# Altium footprint library texas.PCBLIB: 124 footprints (part 4 of 12) (continued)
## HTSSOP32DAP [mm]
pads (33):
  rect 0.3x1 smd: 1(-4.875,-3.95) 2(-4.225,-3.95) 3(-3.575,-3.95) 4(-2.925,-3.95) 5(-2.275,-3.95) 6(-1.625,-3.95) 7(-0.975,-3.95) 8(-0.325,-3.95) 9(0.325,-3.95) 10(0.975,-3.95) 11(1.625,-3.95) 12(2.275,-3.95) 13(2.925,-3.95) 14(3.575,-3.95) 15(4.225,-3.95) 16(4.875,-3.95) 17(4.875,3.95) 18(4.225,3.95) 19(3.575,3.95) 20(2.925,3.95) 21(2.275,3.95) 22(1.625,3.95) 23(0.975,3.95) 24(0.325,3.95) 25(-0.325,3.95) 26(-0.975,3.95) 27(-1.625,3.95) 28(-2.275,3.95) 29(-2.925,3.95) 30(-3.575,3.95) 31(-4.225,3.95) 32(-4.875,3.95)
  rect 11x5.2 smd: EXP(0,0)
Top Overlay:
  circle w0.102: c-4.55,-2.6 r0.325
  lines w0.102: -5.5,-3.4 5.5,-3.4 5.5,3.4 -5.5,3.4 -5.5,-3.4
Top Solder:
  rectangle: -5.035,-4.46 -4.715,-3.44
  rectangle: -5.02,-4.445 -4.73,-3.455
  rectangle: -4.385,-4.46 -4.065,-3.44
  rectangle: -4.37,-4.445 -4.08,-3.455
  rectangle: -3.735,-4.46 -3.415,-3.44
  rectangle: -3.72,-4.445 -3.43,-3.455
  rectangle: -3.085,-4.46 -2.765,-3.44
  rectangle: -3.07,-4.445 -2.78,-3.455
  rectangle: -2.435,-4.46 -2.115,-3.44
  rectangle: -2.42,-4.445 -2.13,-3.455
  rectangle: -1.785,-4.46 -1.465,-3.44
  rectangle: -1.77,-4.445 -1.48,-3.455
  rectangle: -1.135,-4.46 -0.815,-3.44
  rectangle: -1.12,-4.445 -0.83,-3.455
  rectangle: -0.485,-4.46 -0.165,-3.44
  rectangle: -0.47,-4.445 -0.18,-3.455
  rectangle: 0.165,-4.46 0.485,-3.44
  rectangle: 0.18,-4.445 0.47,-3.455
  rectangle: 0.815,-4.46 1.135,-3.44
  rectangle: 0.83,-4.445 1.12,-3.455
  rectangle: 1.465,-4.46 1.785,-3.44
  rectangle: 1.48,-4.445 1.77,-3.455
  rectangle: 2.115,-4.46 2.435,-3.44
  rectangle: 2.13,-4.445 2.42,-3.455
  rectangle: 2.765,-4.46 3.085,-3.44
  rectangle: 2.78,-4.445 3.07,-3.455
  rectangle: 3.415,-4.46 3.735,-3.44
  rectangle: 3.43,-4.445 3.72,-3.455
  rectangle: 4.065,-4.46 4.385,-3.44
  rectangle: 4.08,-4.445 4.37,-3.455
  rectangle: 4.715,-4.46 5.035,-3.44
  rectangle: 4.73,-4.445 5.02,-3.455
  region: 5.035,4.46 4.715,4.46 4.715,3.44 5.035,3.44
  region: 5.02,4.445 4.73,4.445 4.73,3.455 5.02,3.455
  region: 4.385,4.46 4.065,4.46 4.065,3.44 4.385,3.44
  region: 4.37,4.445 4.08,4.445 4.08,3.455 4.37,3.455
  region: 3.735,4.46 3.415,4.46 3.415,3.44 3.735,3.44
  region: 3.72,4.445 3.43,4.445 3.43,3.455 3.72,3.455
  region: 3.085,4.46 2.765,4.46 2.765,3.44 3.085,3.44
  region: 3.07,4.445 2.78,4.445 2.78,3.455 3.07,3.455
  region: 2.435,4.46 2.115,4.46 2.115,3.44 2.435,3.44
  region: 2.42,4.445 2.13,4.445 2.13,3.455 2.42,3.455
  region: 1.785,4.46 1.465,4.46 1.465,3.44 1.785,3.44
  region: 1.77,4.445 1.48,4.445 1.48,3.455 1.77,3.455
  region: 1.135,4.46 0.815,4.46 0.815,3.44 1.135,3.44
  region: 1.12,4.445 0.83,4.445 0.83,3.455 1.12,3.455
  region: 0.485,4.46 0.165,4.46 0.165,3.44 0.485,3.44
  region: 0.47,4.445 0.18,4.445 0.18,3.455 0.47,3.455
  region: -0.165,4.46 -0.485,4.46 -0.485,3.44 -0.165,3.44
  region: -0.18,4.445 -0.47,4.445 -0.47,3.455 -0.18,3.455
  region: -0.815,4.46 -1.135,4.46 -1.135,3.44 -0.815,3.44
  region: -0.83,4.445 -1.12,4.445 -1.12,3.455 -0.83,3.455
  region: -1.465,4.46 -1.785,4.46 -1.785,3.44 -1.465,3.44
  region: -1.48,4.445 -1.77,4.445 -1.77,3.455 -1.48,3.455
  region: -2.115,4.46 -2.435,4.46 -2.435,3.44 -2.115,3.44
  region: -2.13,4.445 -2.42,4.445 -2.42,3.455 -2.13,3.455
  rectangle: -5.5,-2.6 5.5,2.6
  region: -2.765,4.46 -3.085,4.46 -3.085,3.44 -2.765,3.44
  region: -2.78,4.445 -3.07,4.445 -3.07,3.455 -2.78,3.455
  region: -3.415,4.46 -3.735,4.46 -3.735,3.44 -3.415,3.44
  region: -3.43,4.445 -3.72,4.445 -3.72,3.455 -3.43,3.455
  region: -4.065,4.46 -4.385,4.46 -4.385,3.44 -4.065,3.44
  region: -4.08,4.445 -4.37,4.445 -4.37,3.455 -4.08,3.455
  region: -4.715,4.46 -5.035,4.46 -5.035,3.44 -4.715,3.44
  region: -4.73,4.445 -5.02,4.445 -5.02,3.455 -4.73,3.455
Mechanical 16:
  rectangle: -5.025,-4.2 -4.725,-3.45
  rectangle: -4.375,-4.2 -4.075,-3.45
  rectangle: -3.725,-4.2 -3.425,-3.45
  rectangle: -3.075,-4.2 -2.775,-3.45
  rectangle: -2.425,-4.2 -2.125,-3.45
  rectangle: -1.775,-4.2 -1.475,-3.45
  rectangle: -1.125,-4.2 -0.825,-3.45
  rectangle: -0.475,-4.2 -0.175,-3.45
  rectangle: 0.175,-4.2 0.475,-3.45
  rectangle: 0.825,-4.2 1.125,-3.45
  rectangle: 1.475,-4.2 1.775,-3.45
  rectangle: 2.125,-4.2 2.425,-3.45
  rectangle: 2.775,-4.2 3.075,-3.45
  rectangle: 3.425,-4.2 3.725,-3.45
  rectangle: 4.075,-4.2 4.375,-3.45
  rectangle: 4.725,-4.2 5.025,-3.45
  region: 5.025,4.2 4.725,4.2 4.725,3.45 5.025,3.45
  region: 4.375,4.2 4.075,4.2 4.075,3.45 4.375,3.45
  region: 3.725,4.2 3.425,4.2 3.425,3.45 3.725,3.45
  region: 3.075,4.2 2.775,4.2 2.775,3.45 3.075,3.45
  region: 2.425,4.2 2.125,4.2 2.125,3.45 2.425,3.45
  region: 1.775,4.2 1.475,4.2 1.475,3.45 1.775,3.45
  region: 1.125,4.2 0.825,4.2 0.825,3.45 1.125,3.45
  region: 0.475,4.2 0.175,4.2 0.175,3.45 0.475,3.45
  region: -0.175,4.2 -0.475,4.2 -0.475,3.45 -0.175,3.45
  region: -0.825,4.2 -1.125,4.2 -1.125,3.45 -0.825,3.45
  region: -1.475,4.2 -1.775,4.2 -1.775,3.45 -1.475,3.45
  region: -2.125,4.2 -2.425,4.2 -2.425,3.45 -2.125,3.45
  region: -2.775,4.2 -3.075,4.2 -3.075,3.45 -2.775,3.45
  region: -3.425,4.2 -3.725,4.2 -3.725,3.45 -3.425,3.45
  region: -4.075,4.2 -4.375,4.2 -4.375,3.45 -4.075,3.45
  region: -4.725,4.2 -5.025,4.2 -5.025,3.45 -4.725,3.45

## HTSSOP38DAP [mm]
pads (39):
  rect 0.3x1 smd: 1(-5.85,-3.95) 2(-5.2,-3.95) 3(-4.55,-3.95) 4(-3.9,-3.95) 5(-3.25,-3.95) 6(-2.6,-3.95) 7(-1.95,-3.95) 8(-1.3,-3.95) 9(-0.65,-3.95) 10(0,-3.95) 11(0.65,-3.95) 12(1.3,-3.95) 13(1.95,-3.95) 14(2.6,-3.95) 15(3.25,-3.95) 16(3.9,-3.95) 17(4.55,-3.95) 18(5.2,-3.95) 19(5.85,-3.95) 20(5.85,3.95) 21(5.2,3.95) 22(4.55,3.95) 23(3.9,3.95) 24(3.25,3.95) 25(2.6,3.95) 26(1.95,3.95) 27(1.3,3.95) 28(0.65,3.95) 29(0,3.95) 30(-0.65,3.95) 31(-1.3,3.95) 32(-1.95,3.95) 33(-2.6,3.95) 34(-3.25,3.95) 35(-3.9,3.95) 36(-4.55,3.95) 37(-5.2,3.95) 38(-5.85,3.95)
  rect 12.5x5.2 smd: EXP(0,0)
Top Overlay:
  circle w0.102: c-5.2,-2.6 r0.325
  lines w0.102: -6.25,-3.4 6.25,-3.4 6.25,3.4 -6.25,3.4 -6.25,-3.4
Top Solder:
  rectangle: -6.01,-4.46 -5.69,-3.44
  rectangle: -5.995,-4.445 -5.705,-3.455
  rectangle: -5.36,-4.46 -5.04,-3.44
  rectangle: -5.345,-4.445 -5.055,-3.455
  rectangle: -4.71,-4.46 -4.39,-3.44
  rectangle: -4.695,-4.445 -4.405,-3.455
  rectangle: -4.06,-4.46 -3.74,-3.44
  rectangle: -4.045,-4.445 -3.755,-3.455
  rectangle: -3.41,-4.46 -3.09,-3.44
  rectangle: -3.395,-4.445 -3.105,-3.455
  rectangle: -2.76,-4.46 -2.44,-3.44
  rectangle: -2.745,-4.445 -2.455,-3.455
  rectangle: -2.11,-4.46 -1.79,-3.44
  rectangle: -2.095,-4.445 -1.805,-3.455
  rectangle: -1.46,-4.46 -1.14,-3.44
  rectangle: -1.445,-4.445 -1.155,-3.455
  rectangle: -0.81,-4.46 -0.49,-3.44
  rectangle: -0.795,-4.445 -0.505,-3.455
  rectangle: -0.16,-4.46 0.16,-3.44
  rectangle: -0.145,-4.445 0.145,-3.455
  rectangle: 0.49,-4.46 0.81,-3.44
  rectangle: 0.505,-4.445 0.795,-3.455
  rectangle: 1.14,-4.46 1.46,-3.44
  rectangle: 1.155,-4.445 1.445,-3.455
  rectangle: 1.79,-4.46 2.11,-3.44
  rectangle: 1.805,-4.445 2.095,-3.455
  rectangle: 2.44,-4.46 2.76,-3.44
  rectangle: 2.455,-4.445 2.745,-3.455
  rectangle: 3.09,-4.46 3.41,-3.44
  rectangle: 3.105,-4.445 3.395,-3.455
  rectangle: 3.74,-4.46 4.06,-3.44
  rectangle: 3.755,-4.445 4.045,-3.455
  rectangle: -6.25,-2.6 6.25,2.6
  rectangle: 4.39,-4.46 4.71,-3.44
  rectangle: 4.405,-4.445 4.695,-3.455
  rectangle: 5.04,-4.46 5.36,-3.44
  rectangle: 5.055,-4.445 5.345,-3.455
  rectangle: 5.69,-4.46 6.01,-3.44
  rectangle: 5.705,-4.445 5.995,-3.455
  region: 6.01,4.46 5.69,4.46 5.69,3.44 6.01,3.44
  region: 5.995,4.445 5.705,4.445 5.705,3.455 5.995,3.455
  region: 5.36,4.46 5.04,4.46 5.04,3.44 5.36,3.44
  region: 5.345,4.445 5.055,4.445 5.055,3.455 5.345,3.455
  region: 4.71,4.46 4.39,4.46 4.39,3.44 4.71,3.44
  region: 4.695,4.445 4.405,4.445 4.405,3.455 4.695,3.455
  region: 4.06,4.46 3.74,4.46 3.74,3.44 4.06,3.44
  region: 4.045,4.445 3.755,4.445 3.755,3.455 4.045,3.455
  region: 3.41,4.46 3.09,4.46 3.09,3.44 3.41,3.44
  region: 3.395,4.445 3.105,4.445 3.105,3.455 3.395,3.455
  region: 2.76,4.46 2.44,4.46 2.44,3.44 2.76,3.44
  region: 2.745,4.445 2.455,4.445 2.455,3.455 2.745,3.455
  region: 2.11,4.46 1.79,4.46 1.79,3.44 2.11,3.44
  region: 2.095,4.445 1.805,4.445 1.805,3.455 2.095,3.455
  region: 1.46,4.46 1.14,4.46 1.14,3.44 1.46,3.44
  region: 1.445,4.445 1.155,4.445 1.155,3.455 1.445,3.455
  region: 0.81,4.46 0.49,4.46 0.49,3.44 0.81,3.44
  region: 0.795,4.445 0.505,4.445 0.505,3.455 0.795,3.455
  region: 0.16,4.46 -0.16,4.46 -0.16,3.44 0.16,3.44
  region: 0.145,4.445 -0.145,4.445 -0.145,3.455 0.145,3.455
  region: -0.49,4.46 -0.81,4.46 -0.81,3.44 -0.49,3.44
  region: -0.505,4.445 -0.795,4.445 -0.795,3.455 -0.505,3.455
  region: -1.14,4.46 -1.46,4.46 -1.46,3.44 -1.14,3.44
  region: -1.155,4.445 -1.445,4.445 -1.445,3.455 -1.155,3.455
  region: -1.79,4.46 -2.11,4.46 -2.11,3.44 -1.79,3.44
  region: -1.805,4.445 -2.095,4.445 -2.095,3.455 -1.805,3.455
  region: -2.44,4.46 -2.76,4.46 -2.76,3.44 -2.44,3.44
  region: -2.455,4.445 -2.745,4.445 -2.745,3.455 -2.455,3.455
  region: -3.09,4.46 -3.41,4.46 -3.41,3.44 -3.09,3.44
  region: -3.105,4.445 -3.395,4.445 -3.395,3.455 -3.105,3.455
  region: -3.74,4.46 -4.06,4.46 -4.06,3.44 -3.74,3.44
  region: -3.755,4.445 -4.045,4.445 -4.045,3.455 -3.755,3.455
  region: -4.39,4.46 -4.71,4.46 -4.71,3.44 -4.39,3.44
  region: -4.405,4.445 -4.695,4.445 -4.695,3.455 -4.405,3.455
  region: -5.04,4.46 -5.36,4.46 -5.36,3.44 -5.04,3.44
  region: -5.055,4.445 -5.345,4.445 -5.345,3.455 -5.055,3.455
  region: -5.69,4.46 -6.01,4.46 -6.01,3.44 -5.69,3.44
  region: -5.705,4.445 -5.995,4.445 -5.995,3.455 -5.705,3.455
Mechanical 16:
  rectangle: -6,-4.2 -5.7,-3.45
  rectangle: -5.35,-4.2 -5.05,-3.45
  rectangle: -4.7,-4.2 -4.4,-3.45
  rectangle: -4.05,-4.2 -3.75,-3.45
  rectangle: -3.4,-4.2 -3.1,-3.45
  rectangle: -2.75,-4.2 -2.45,-3.45
  rectangle: -2.1,-4.2 -1.8,-3.45
  rectangle: -1.45,-4.2 -1.15,-3.45
  rectangle: -0.8,-4.2 -0.5,-3.45
  rectangle: -0.15,-4.2 0.15,-3.45
  rectangle: 0.5,-4.2 0.8,-3.45
  rectangle: 1.15,-4.2 1.45,-3.45
  rectangle: 1.8,-4.2 2.1,-3.45
  rectangle: 2.45,-4.2 2.75,-3.45
  rectangle: 3.1,-4.2 3.4,-3.45
  rectangle: 3.75,-4.2 4.05,-3.45
  rectangle: 4.4,-4.2 4.7,-3.45
  rectangle: 5.05,-4.2 5.35,-3.45
  rectangle: 5.7,-4.2 6,-3.45
  region: 6,4.2 5.7,4.2 5.7,3.45 6,3.45
  region: 5.35,4.2 5.05,4.2 5.05,3.45 5.35,3.45
  region: 4.7,4.2 4.4,4.2 4.4,3.45 4.7,3.45
  region: 4.05,4.2 3.75,4.2 3.75,3.45 4.05,3.45
  region: 3.4,4.2 3.1,4.2 3.1,3.45 3.4,3.45
  region: 2.75,4.2 2.45,4.2 2.45,3.45 2.75,3.45
  region: 2.1,4.2 1.8,4.2 1.8,3.45 2.1,3.45
  region: 1.45,4.2 1.15,4.2 1.15,3.45 1.45,3.45
  region: 0.8,4.2 0.5,4.2 0.5,3.45 0.8,3.45
  region: 0.15,4.2 -0.15,4.2 -0.15,3.45 0.15,3.45
  region: -0.5,4.2 -0.8,4.2 -0.8,3.45 -0.5,3.45
  region: -1.15,4.2 -1.45,4.2 -1.45,3.45 -1.15,3.45
  region: -1.8,4.2 -2.1,4.2 -2.1,3.45 -1.8,3.45
  region: -2.45,4.2 -2.75,4.2 -2.75,3.45 -2.45,3.45
  region: -3.1,4.2 -3.4,4.2 -3.4,3.45 -3.1,3.45
  region: -3.75,4.2 -4.05,4.2 -4.05,3.45 -3.75,3.45
  region: -4.4,4.2 -4.7,4.2 -4.7,3.45 -4.4,3.45
  region: -5.05,4.2 -5.35,4.2 -5.35,3.45 -5.05,3.45
  region: -5.7,4.2 -6,4.2 -6,3.45 -5.7,3.45

## HTSSOP38DCP [mm]
pads (39):
  rect 0.3x1.1 smd: 1(-4.5,-2.9) 2(-4,-2.9) 3(-3.5,-2.9) 4(-3,-2.9) 5(-2.5,-2.9) 6(-2,-2.9) 7(-1.5,-2.9) 8(-1,-2.9) 9(-0.5,-2.9) 10(0,-2.9) 11(0.5,-2.9) 12(1,-2.9) 13(1.5,-2.9) 14(2,-2.9) 15(2.5,-2.9) 16(3,-2.9) 17(3.5,-2.9) 18(4,-2.9) 19(4.5,-2.9) 20(4.5,2.9) 21(4,2.9) 22(3.5,2.9) 23(3,2.9) 24(2.5,2.9) 25(2,2.9) 26(1.5,2.9) 27(1,2.9) 28(0.5,2.9) 29(0,2.9) 30(-0.5,2.9) 31(-1,2.9) 32(-1.5,2.9) 33(-2,2.9) 34(-2.5,2.9) 35(-3,2.9) 36(-3.5,2.9) 37(-4,2.9) 38(-4.5,2.9)
  rect 9.7x3.4 smd: EXP@1(0,0)
Top Overlay:
  circle w0.102: c-3.195,-1.35 r0.283
  lines w0.102: -4.85,-2.2 4.85,-2.2 4.85,2.2 -4.85,2.2 -4.85,-2.2
Top Paste:
  rectangle: -4.64,-3.435 -4.36,-2.365
  rectangle: -4.14,-3.435 -3.86,-2.365
  rectangle: -3.64,-3.435 -3.36,-2.365
  rectangle: -3.14,-3.435 -2.86,-2.365
  rectangle: -2.64,-3.435 -2.36,-2.365
  rectangle: -2.14,-3.435 -1.86,-2.365
  rectangle: -1.64,-3.435 -1.36,-2.365
  rectangle: -1.14,-3.435 -0.86,-2.365
  rectangle: -0.64,-3.435 -0.36,-2.365
  rectangle: -0.14,-3.435 0.14,-2.365
  rectangle: 0.36,-3.435 0.64,-2.365
  rectangle: 0.86,-3.435 1.14,-2.365
  rectangle: 1.36,-3.435 1.64,-2.365
  rectangle: 1.86,-3.435 2.14,-2.365
  rectangle: 2.36,-3.435 2.64,-2.365
  rectangle: 2.86,-3.435 3.14,-2.365
  rectangle: 3.36,-3.435 3.64,-2.365
  rectangle: 3.86,-3.435 4.14,-2.365
  rectangle: 4.36,-3.435 4.64,-2.365
  region: 4.64,3.435 4.36,3.435 4.36,2.365 4.64,2.365
  region: 4.14,3.435 3.86,3.435 3.86,2.365 4.14,2.365
  region: 3.64,3.435 3.36,3.435 3.36,2.365 3.64,2.365
  region: 3.14,3.435 2.86,3.435 2.86,2.365 3.14,2.365
  region: 2.64,3.435 2.36,3.435 2.36,2.365 2.64,2.365
  region: 2.14,3.435 1.86,3.435 1.86,2.365 2.14,2.365
  region: 1.64,3.435 1.36,3.435 1.36,2.365 1.64,2.365
  region: 1.14,3.435 0.86,3.435 0.86,2.365 1.14,2.365
  region: 0.64,3.435 0.36,3.435 0.36,2.365 0.64,2.365
  region: 0.14,3.435 -0.14,3.435 -0.14,2.365 0.14,2.365
  region: -0.36,3.435 -0.64,3.435 -0.64,2.365 -0.36,2.365
  region: -0.86,3.435 -1.14,3.435 -1.14,2.365 -0.86,2.365
  region: -1.36,3.435 -1.64,3.435 -1.64,2.365 -1.36,2.365
  region: -1.86,3.435 -2.14,3.435 -2.14,2.365 -1.86,2.365
  region: -2.36,3.435 -2.64,3.435 -2.64,2.365 -2.36,2.365
  region: -2.86,3.435 -3.14,3.435 -3.14,2.365 -2.86,2.365
  region: -3.36,3.435 -3.64,3.435 -3.64,2.365 -3.36,2.365
  region: -3.86,3.435 -4.14,3.435 -4.14,2.365 -3.86,2.365
  region: -4.36,3.435 -4.64,3.435 -4.64,2.365 -4.36,2.365
Top Solder:
  rectangle: -4.655,-3.455 -4.345,-2.345
  rectangle: -4.155,-3.455 -3.845,-2.345
  rectangle: -3.655,-3.455 -3.345,-2.345
  rectangle: -3.155,-3.455 -2.845,-2.345
  rectangle: -2.655,-3.455 -2.345,-2.345
  rectangle: -2.155,-3.455 -1.845,-2.345
  rectangle: -1.655,-3.455 -1.345,-2.345
  rectangle: -1.155,-3.455 -0.845,-2.345
  rectangle: -0.655,-3.455 -0.345,-2.345
  rectangle: -0.155,-3.455 0.155,-2.345
  rectangle: 0.345,-3.455 0.655,-2.345
  rectangle: 0.845,-3.455 1.155,-2.345
  rectangle: 1.345,-3.455 1.655,-2.345
  rectangle: 1.845,-3.455 2.155,-2.345
  rectangle: 2.345,-3.455 2.655,-2.345
  rectangle: 2.845,-3.455 3.155,-2.345
  rectangle: 3.345,-3.455 3.655,-2.345
  rectangle: 3.845,-3.455 4.155,-2.345
  rectangle: 4.345,-3.455 4.655,-2.345
  region: 4.655,3.455 4.345,3.455 4.345,2.345 4.655,2.345
  region: 4.155,3.455 3.845,3.455 3.845,2.345 4.155,2.345
  region: 3.655,3.455 3.345,3.455 3.345,2.345 3.655,2.345
  region: 3.155,3.455 2.845,3.455 2.845,2.345 3.155,2.345
  region: 2.655,3.455 2.345,3.455 2.345,2.345 2.655,2.345
  region: 2.155,3.455 1.845,3.455 1.845,2.345 2.155,2.345
  region: 1.655,3.455 1.345,3.455 1.345,2.345 1.655,2.345
  region: 1.155,3.455 0.845,3.455 0.845,2.345 1.155,2.345
  region: 0.655,3.455 0.345,3.455 0.345,2.345 0.655,2.345
  rectangle: -4.85,-1.7 4.85,1.7
  region: 0.155,3.455 -0.155,3.455 -0.155,2.345 0.155,2.345
  region: -0.345,3.455 -0.655,3.455 -0.655,2.345 -0.345,2.345
  region: -0.845,3.455 -1.155,3.455 -1.155,2.345 -0.845,2.345
  region: -1.345,3.455 -1.655,3.455 -1.655,2.345 -1.345,2.345
  region: -1.845,3.455 -2.155,3.455 -2.155,2.345 -1.845,2.345
  region: -2.345,3.455 -2.655,3.455 -2.655,2.345 -2.345,2.345
  region: -2.845,3.455 -3.155,3.455 -3.155,2.345 -2.845,2.345
  region: -3.345,3.455 -3.655,3.455 -3.655,2.345 -3.345,2.345
  region: -3.845,3.455 -4.155,3.455 -4.155,2.345 -3.845,2.345
  region: -4.345,3.455 -4.655,3.455 -4.655,2.345 -4.345,2.345
Mechanical 16:
  rectangle: -4.61,-3.3 -4.38,-2.245
  rectangle: -4.11,-3.3 -3.88,-2.245
  rectangle: -3.61,-3.3 -3.38,-2.245
  rectangle: -3.11,-3.3 -2.88,-2.245
  rectangle: -2.61,-3.3 -2.38,-2.245
  rectangle: -2.11,-3.3 -1.88,-2.245
  rectangle: -1.61,-3.3 -1.38,-2.245
  rectangle: -1.11,-3.3 -0.88,-2.245
  rectangle: -0.61,-3.3 -0.38,-2.245
  rectangle: -0.11,-3.3 0.12,-2.245
  rectangle: 0.39,-3.3 0.62,-2.245
  rectangle: 0.89,-3.3 1.12,-2.245
  rectangle: 1.39,-3.3 1.62,-2.245
  rectangle: 1.89,-3.3 2.12,-2.245
  rectangle: 2.39,-3.3 2.62,-2.245
  rectangle: 2.89,-3.3 3.12,-2.245
  rectangle: 3.39,-3.3 3.62,-2.245
  rectangle: 3.89,-3.3 4.12,-2.245
  rectangle: 4.39,-3.3 4.62,-2.245
  region: 4.61,3.3 4.38,3.3 4.38,2.245 4.61,2.245
  region: 4.11,3.3 3.88,3.3 3.88,2.245 4.11,2.245
  region: 3.61,3.3 3.38,3.3 3.38,2.245 3.61,2.245
  region: 3.11,3.3 2.88,3.3 2.88,2.245 3.11,2.245
  region: 2.61,3.3 2.38,3.3 2.38,2.245 2.61,2.245
  region: 2.11,3.3 1.88,3.3 1.88,2.245 2.11,2.245
  region: 1.61,3.3 1.38,3.3 1.38,2.245 1.61,2.245
  region: 1.11,3.3 0.88,3.3 0.88,2.245 1.11,2.245
  region: 0.61,3.3 0.38,3.3 0.38,2.245 0.61,2.245
  region: 0.11,3.3 -0.12,3.3 -0.12,2.245 0.11,2.245
  region: -0.39,3.3 -0.62,3.3 -0.62,2.245 -0.39,2.245
  region: -0.89,3.3 -1.12,3.3 -1.12,2.245 -0.89,2.245
  region: -1.39,3.3 -1.62,3.3 -1.62,2.245 -1.39,2.245
  region: -1.89,3.3 -2.12,3.3 -2.12,2.245 -1.89,2.245
  region: -2.39,3.3 -2.62,3.3 -2.62,2.245 -2.39,2.245
  region: -2.89,3.3 -3.12,3.3 -3.12,2.245 -2.89,2.245
  region: -3.39,3.3 -3.62,3.3 -3.62,2.245 -3.39,2.245
  region: -3.89,3.3 -4.12,3.3 -4.12,2.245 -3.89,2.245
  region: -4.39,3.3 -4.62,3.3 -4.62,2.245 -4.39,2.245

## HTSSOP44DCP [mm]
pads (45):
  rect 0.3x1.1 smd: 1(-5.25,-2.9) 2(-4.75,-2.9) 3(-4.25,-2.9) 4(-3.75,-2.9) 5(-3.25,-2.9) 6(-2.75,-2.9) 7(-2.25,-2.9) 8(-1.75,-2.9) 9(-1.25,-2.9) 10(-0.75,-2.9) 11(-0.25,-2.9) 12(0.25,-2.9) 13(0.75,-2.9) 14(1.25,-2.9) 15(1.75,-2.9) 16(2.25,-2.9) 17(2.75,-2.9) 18(3.25,-2.9) 19(3.75,-2.9) 20(4.25,-2.9) 21(4.75,-2.9) 22(5.25,-2.9) 23(5.25,2.9) 24(4.75,2.9) 25(4.25,2.9) 26(3.75,2.9) 27(3.25,2.9) 28(2.75,2.9) 29(2.25,2.9) 30(1.75,2.9) 31(1.25,2.9) 32(0.75,2.9) 33(0.25,2.9) 34(-0.25,2.9) 35(-0.75,2.9) 36(-1.25,2.9) 37(-1.75,2.9) 38(-2.25,2.9) 39(-2.75,2.9) 40(-3.25,2.9) 41(-3.75,2.9) 42(-4.25,2.9) 43(-4.75,2.9) 44(-5.25,2.9)
  rect 11.3x3.4 smd: EXP(0,0)
Top Overlay:
  circle w0.102: c-4.695,-1.35 r0.283
  lines w0.102: -5.65,-2.2 5.65,-2.2 5.65,2.2 -5.65,2.2 -5.65,-2.2
Top Paste:
  rectangle: -5.39,-3.435 -5.11,-2.365
  rectangle: -4.89,-3.435 -4.61,-2.365
  rectangle: -4.39,-3.435 -4.11,-2.365
  rectangle: -3.89,-3.435 -3.61,-2.365
  rectangle: -3.39,-3.435 -3.11,-2.365
  rectangle: -2.89,-3.435 -2.61,-2.365
  rectangle: -2.39,-3.435 -2.11,-2.365
  rectangle: -1.89,-3.435 -1.61,-2.365
  rectangle: -1.39,-3.435 -1.11,-2.365
  rectangle: -0.89,-3.435 -0.61,-2.365
  rectangle: -0.39,-3.435 -0.11,-2.365
  rectangle: 0.11,-3.435 0.39,-2.365
  rectangle: 0.61,-3.435 0.89,-2.365
  rectangle: 1.11,-3.435 1.39,-2.365
  rectangle: 1.61,-3.435 1.89,-2.365
  rectangle: 2.11,-3.435 2.39,-2.365
  rectangle: 2.61,-3.435 2.89,-2.365
  rectangle: 3.11,-3.435 3.39,-2.365
  rectangle: 3.61,-3.435 3.89,-2.365
  rectangle: 4.11,-3.435 4.39,-2.365
  rectangle: 4.61,-3.435 4.89,-2.365
  rectangle: 5.11,-3.435 5.39,-2.365
  region: 5.39,3.435 5.11,3.435 5.11,2.365 5.39,2.365
  region: 4.89,3.435 4.61,3.435 4.61,2.365 4.89,2.365
  region: 4.39,3.435 4.11,3.435 4.11,2.365 4.39,2.365
  region: 3.89,3.435 3.61,3.435 3.61,2.365 3.89,2.365
  region: 3.39,3.435 3.11,3.435 3.11,2.365 3.39,2.365
  region: 2.89,3.435 2.61,3.435 2.61,2.365 2.89,2.365
  region: 2.39,3.435 2.11,3.435 2.11,2.365 2.39,2.365
  region: 1.89,3.435 1.61,3.435 1.61,2.365 1.89,2.365
  region: 1.39,3.435 1.11,3.435 1.11,2.365 1.39,2.365
  region: 0.89,3.435 0.61,3.435 0.61,2.365 0.89,2.365
  region: 0.39,3.435 0.11,3.435 0.11,2.365 0.39,2.365
  region: -0.11,3.435 -0.39,3.435 -0.39,2.365 -0.11,2.365
  region: -0.61,3.435 -0.89,3.435 -0.89,2.365 -0.61,2.365
  region: -1.11,3.435 -1.39,3.435 -1.39,2.365 -1.11,2.365
  region: -1.61,3.435 -1.89,3.435 -1.89,2.365 -1.61,2.365
  region: -2.11,3.435 -2.39,3.435 -2.39,2.365 -2.11,2.365
  region: -2.61,3.435 -2.89,3.435 -2.89,2.365 -2.61,2.365
  region: -3.11,3.435 -3.39,3.435 -3.39,2.365 -3.11,2.365
  region: -3.61,3.435 -3.89,3.435 -3.89,2.365 -3.61,2.365
  region: -4.11,3.435 -4.39,3.435 -4.39,2.365 -4.11,2.365
  region: -4.61,3.435 -4.89,3.435 -4.89,2.365 -4.61,2.365
  region: -5.11,3.435 -5.39,3.435 -5.39,2.365 -5.11,2.365
Top Solder:
  rectangle: -5.405,-3.455 -5.095,-2.345
  rectangle: -4.905,-3.455 -4.595,-2.345
  rectangle: -4.405,-3.455 -4.095,-2.345
  rectangle: -3.905,-3.455 -3.595,-2.345
  rectangle: -3.405,-3.455 -3.095,-2.345
  rectangle: -2.905,-3.455 -2.595,-2.345
  rectangle: -2.405,-3.455 -2.095,-2.345
  rectangle: -1.905,-3.455 -1.595,-2.345
  rectangle: -1.405,-3.455 -1.095,-2.345
  rectangle: -0.905,-3.455 -0.595,-2.345
  rectangle: -0.405,-3.455 -0.095,-2.345
  rectangle: 0.095,-3.455 0.405,-2.345
  rectangle: 0.595,-3.455 0.905,-2.345
  rectangle: 1.095,-3.455 1.405,-2.345
  rectangle: 1.595,-3.455 1.905,-2.345
  rectangle: 2.095,-3.455 2.405,-2.345
  rectangle: 2.595,-3.455 2.905,-2.345
  rectangle: 3.095,-3.455 3.405,-2.345
  rectangle: 3.595,-3.455 3.905,-2.345
  rectangle: 4.095,-3.455 4.405,-2.345
  rectangle: 4.595,-3.455 4.905,-2.345
  rectangle: 5.095,-3.455 5.405,-2.345
  region: 5.405,3.455 5.095,3.455 5.095,2.345 5.405,2.345
  region: 4.905,3.455 4.595,3.455 4.595,2.345 4.905,2.345
  region: 4.405,3.455 4.095,3.455 4.095,2.345 4.405,2.345
  region: 3.905,3.455 3.595,3.455 3.595,2.345 3.905,2.345
  region: 3.405,3.455 3.095,3.455 3.095,2.345 3.405,2.345
  region: 2.905,3.455 2.595,3.455 2.595,2.345 2.905,2.345
  rectangle: -5.65,-1.7 5.65,1.7
  region: 2.405,3.455 2.095,3.455 2.095,2.345 2.405,2.345
  region: 1.905,3.455 1.595,3.455 1.595,2.345 1.905,2.345
  region: 1.405,3.455 1.095,3.455 1.095,2.345 1.405,2.345
  region: 0.905,3.455 0.595,3.455 0.595,2.345 0.905,2.345
  region: 0.405,3.455 0.095,3.455 0.095,2.345 0.405,2.345
  region: -0.095,3.455 -0.405,3.455 -0.405,2.345 -0.095,2.345
  region: -0.595,3.455 -0.905,3.455 -0.905,2.345 -0.595,2.345
  region: -1.095,3.455 -1.405,3.455 -1.405,2.345 -1.095,2.345
  region: -1.595,3.455 -1.905,3.455 -1.905,2.345 -1.595,2.345
  region: -2.095,3.455 -2.405,3.455 -2.405,2.345 -2.095,2.345
  region: -2.595,3.455 -2.905,3.455 -2.905,2.345 -2.595,2.345
  region: -3.095,3.455 -3.405,3.455 -3.405,2.345 -3.095,2.345
  region: -3.595,3.455 -3.905,3.455 -3.905,2.345 -3.595,2.345
  region: -4.095,3.455 -4.405,3.455 -4.405,2.345 -4.095,2.345
  region: -4.595,3.455 -4.905,3.455 -4.905,2.345 -4.595,2.345
  region: -5.095,3.455 -5.405,3.455 -5.405,2.345 -5.095,2.345
Mechanical 16:
  rectangle: -5.36,-3.3 -5.13,-2.245
  rectangle: -4.86,-3.3 -4.63,-2.245
  rectangle: -4.36,-3.3 -4.13,-2.245
  rectangle: -3.86,-3.3 -3.63,-2.245
  rectangle: -3.36,-3.3 -3.13,-2.245
  rectangle: -2.86,-3.3 -2.63,-2.245
  rectangle: -2.36,-3.3 -2.13,-2.245
  rectangle: -1.86,-3.3 -1.63,-2.245
  rectangle: -1.36,-3.3 -1.13,-2.245
  rectangle: -0.86,-3.3 -0.63,-2.245
  rectangle: -0.36,-3.3 -0.13,-2.245
  rectangle: 0.14,-3.3 0.37,-2.245
  rectangle: 0.64,-3.3 0.87,-2.245
  rectangle: 1.14,-3.3 1.37,-2.245
  rectangle: 1.64,-3.3 1.87,-2.245
  rectangle: 2.14,-3.3 2.37,-2.245
  rectangle: 2.64,-3.3 2.87,-2.245
  rectangle: 3.14,-3.3 3.37,-2.245
  rectangle: 3.64,-3.3 3.87,-2.245
  rectangle: 4.14,-3.3 4.37,-2.245
  rectangle: 4.64,-3.3 4.87,-2.245
  rectangle: 5.14,-3.3 5.37,-2.245
  region: 5.36,3.3 5.13,3.3 5.13,2.245 5.36,2.245
  region: 4.86,3.3 4.63,3.3 4.63,2.245 4.86,2.245
  region: 4.36,3.3 4.13,3.3 4.13,2.245 4.36,2.245
  region: 3.86,3.3 3.63,3.3 3.63,2.245 3.86,2.245
  region: 3.36,3.3 3.13,3.3 3.13,2.245 3.36,2.245
  region: 2.86,3.3 2.63,3.3 2.63,2.245 2.86,2.245
  region: 2.36,3.3 2.13,3.3 2.13,2.245 2.36,2.245
  region: 1.86,3.3 1.63,3.3 1.63,2.245 1.86,2.245
  region: 1.36,3.3 1.13,3.3 1.13,2.245 1.36,2.245
  region: 0.86,3.3 0.63,3.3 0.63,2.245 0.86,2.245
  region: 0.36,3.3 0.13,3.3 0.13,2.245 0.36,2.245
  region: -0.14,3.3 -0.37,3.3 -0.37,2.245 -0.14,2.245
  region: -0.64,3.3 -0.87,3.3 -0.87,2.245 -0.64,2.245
  region: -1.14,3.3 -1.37,3.3 -1.37,2.245 -1.14,2.245
  region: -1.64,3.3 -1.87,3.3 -1.87,2.245 -1.64,2.245
  region: -2.14,3.3 -2.37,3.3 -2.37,2.245 -2.14,2.245
  region: -2.64,3.3 -2.87,3.3 -2.87,2.245 -2.64,2.245
  region: -3.14,3.3 -3.37,3.3 -3.37,2.245 -3.14,2.245
  region: -3.64,3.3 -3.87,3.3 -3.87,2.245 -3.64,2.245
  region: -4.14,3.3 -4.37,3.3 -4.37,2.245 -4.14,2.245
  region: -4.64,3.3 -4.87,3.3 -4.87,2.245 -4.64,2.245
  region: -5.14,3.3 -5.37,3.3 -5.37,2.245 -5.14,2.245